# Altium footprint library ref-packages.PCBLIB: 1544 footprints (part 77 of 103)
Each footprint in its own frame and in the unit in brackets; x right, y up, seen from the top. Pads: shape width x height; smd on the part's side, far side on the other; paste and mask are expansions set on the pad; w line width, h text height; cw(c..) or ccw(c..) is an arc to the next point about the centre after c.
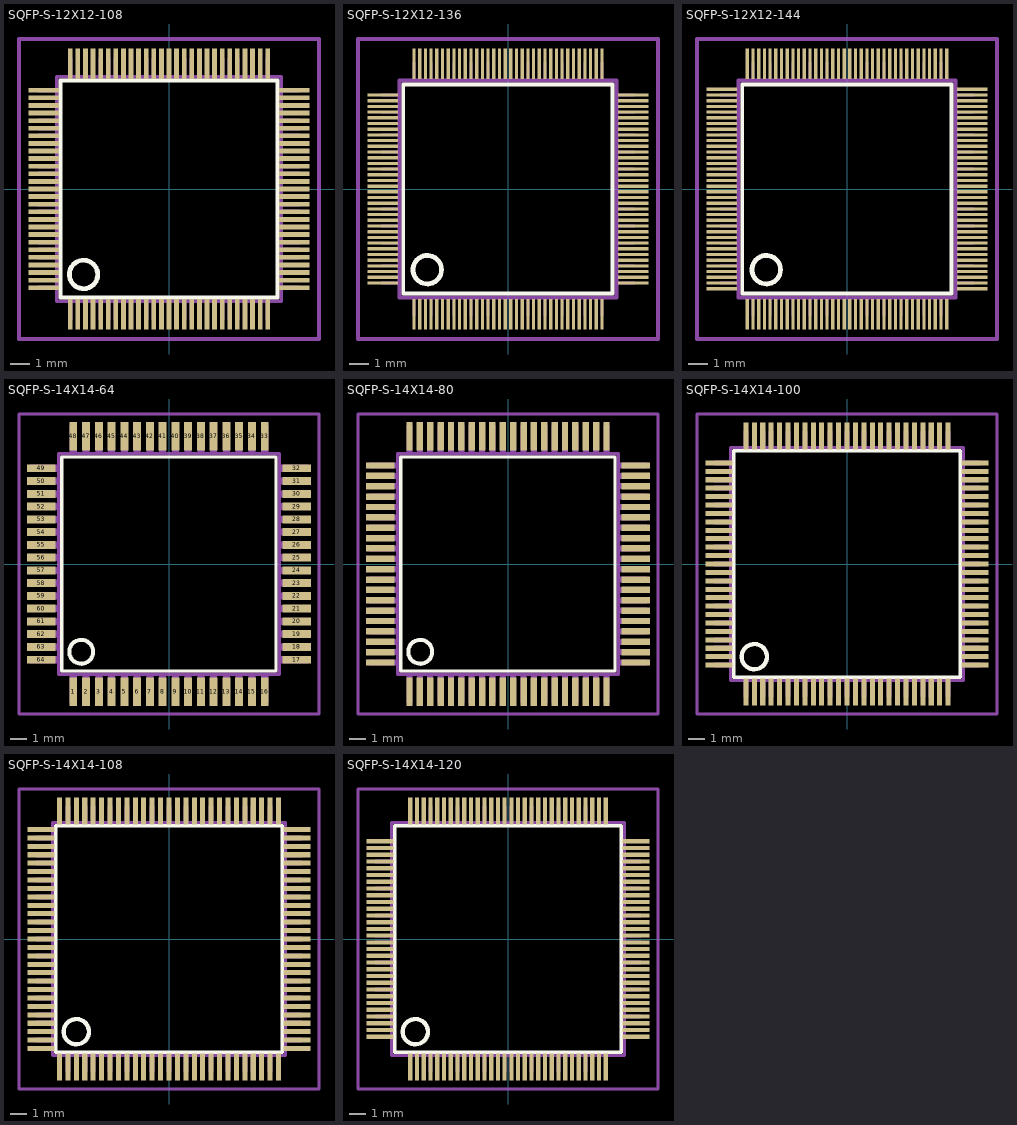
[diagram p76: the footprints below, top view; thin cyan lines are the x and y axes]

## SQFP-S-12X12-108 [mm]
pads (108):
  rect 0.25x1.6 smd: 1(-5.2,-6.6) 2(-4.8,-6.6) 3(-4.4,-6.6) 4(-4,-6.6) 5(-3.6,-6.6) 6(-3.2,-6.6) 7(-2.8,-6.6) 8(-2.4,-6.6) 9(-2,-6.6) 10(-1.6,-6.6) 11(-1.2,-6.6) 12(-0.8,-6.6) 13(-0.4,-6.6) 14(0,-6.6) 15(0.4,-6.6) 16(0.8,-6.6) 17(1.2,-6.6) 18(1.6,-6.6) 19(2,-6.6) 20(2.4,-6.6) 21(2.8,-6.6) 22(3.2,-6.6) 23(3.6,-6.6) 24(4,-6.6) 25(4.4,-6.6) 26(4.8,-6.6) 27(5.2,-6.6) 55(5.2,6.6) 56(4.8,6.6) 57(4.4,6.6) 58(4,6.6) 59(3.6,6.6) 60(3.2,6.6) 61(2.8,6.6) 62(2.4,6.6) 63(2,6.6) 64(1.6,6.6) 65(1.2,6.6) 66(0.8,6.6) 67(0.4,6.6) 68(0,6.6) 69(-0.4,6.6) 70(-0.8,6.6) 71(-1.2,6.6) 72(-1.6,6.6) 73(-2,6.6) 74(-2.4,6.6) 75(-2.8,6.6) 76(-3.2,6.6) 77(-3.6,6.6) 78(-4,6.6) 79(-4.4,6.6) 80(-4.8,6.6) 81(-5.2,6.6)
  rect 1.6x0.25 smd: 28(6.6,-5.2) 29(6.6,-4.8) 30(6.6,-4.4) 31(6.6,-4) 32(6.6,-3.6) 33(6.6,-3.2) 34(6.6,-2.8) 35(6.6,-2.4) 36(6.6,-2) 37(6.6,-1.6) 38(6.6,-1.2) 39(6.6,-0.8) 40(6.6,-0.4) 41(6.6,0) 42(6.6,0.4) 43(6.6,0.8) 44(6.6,1.2) 45(6.6,1.6) 46(6.6,2) 47(6.6,2.4) 48(6.6,2.8) 49(6.6,3.2) 50(6.6,3.6) 51(6.6,4) 52(6.6,4.4) 53(6.6,4.8) 54(6.6,5.2) 82(-6.6,5.2) 83(-6.6,4.8) 84(-6.6,4.4) 85(-6.6,4) 86(-6.6,3.6) 87(-6.6,3.2) 88(-6.6,2.8) 89(-6.6,2.4) 90(-6.6,2) 91(-6.6,1.6) 92(-6.6,1.2) 93(-6.6,0.8) 94(-6.6,0.4) 95(-6.6,0) 96(-6.6,-0.4) 97(-6.6,-0.8) 98(-6.6,-1.2) 99(-6.6,-1.6) 100(-6.6,-2) 101(-6.6,-2.4) 102(-6.6,-2.8) 103(-6.6,-3.2) 104(-6.6,-3.6) 105(-6.6,-4) 106(-6.6,-4.4) 107(-6.6,-4.8) 108(-6.6,-5.2)
Top Overlay:
  circle w0.254: c-4.5,-4.5 r0.75
  lines w0.203: -5.72,-5.71 5.71,-5.71 5.71,5.71 -5.72,5.71 -5.72,-5.71
Mechanical 16:
  rectangle: -5.31,-6.9 -5.09,-5.95
  rectangle: -4.91,-6.9 -4.69,-5.95
  rectangle: -4.51,-6.9 -4.29,-5.95
  rectangle: -4.11,-6.9 -3.89,-5.95
  rectangle: -3.71,-6.9 -3.49,-5.95
  rectangle: -3.31,-6.9 -3.09,-5.95
  rectangle: -2.91,-6.9 -2.69,-5.95
  rectangle: -2.51,-6.9 -2.29,-5.95
  rectangle: -2.11,-6.9 -1.89,-5.95
  rectangle: -1.71,-6.9 -1.49,-5.95
  rectangle: -1.31,-6.9 -1.09,-5.95
  rectangle: -0.91,-6.9 -0.69,-5.95
  rectangle: -0.51,-6.9 -0.29,-5.95
  rectangle: -0.11,-6.9 0.11,-5.95
  rectangle: 0.29,-6.9 0.51,-5.95
  rectangle: 0.69,-6.9 0.91,-5.95
  rectangle: 1.09,-6.9 1.31,-5.95
  rectangle: 1.49,-6.9 1.71,-5.95
  rectangle: 1.89,-6.9 2.11,-5.95
  rectangle: 2.29,-6.9 2.51,-5.95
  rectangle: 2.69,-6.9 2.91,-5.95
  rectangle: 3.09,-6.9 3.31,-5.95
  rectangle: 3.49,-6.9 3.71,-5.95
  rectangle: 3.89,-6.9 4.11,-5.95
  rectangle: 4.29,-6.9 4.51,-5.95
  rectangle: 4.69,-6.9 4.91,-5.95
  rectangle: 5.09,-6.9 5.31,-5.95
  rectangle: 5.95,-5.31 6.9,-5.09
  rectangle: 5.95,-4.91 6.9,-4.69
  rectangle: 5.95,-4.51 6.9,-4.29
  rectangle: 5.95,-4.11 6.9,-3.89
  rectangle: 5.95,-3.71 6.9,-3.49
  rectangle: 5.95,-3.31 6.9,-3.09
  rectangle: 5.95,-2.91 6.9,-2.69
  rectangle: 5.95,-2.51 6.9,-2.29
  rectangle: 5.95,-2.11 6.9,-1.89
  rectangle: 5.95,-1.71 6.9,-1.49
  rectangle: 5.95,-1.31 6.9,-1.09
  rectangle: 5.95,-0.91 6.9,-0.69
  rectangle: 5.95,-0.51 6.9,-0.29
  rectangle: 5.95,-0.11 6.9,0.11
  rectangle: 5.95,0.29 6.9,0.51
  rectangle: 5.95,0.69 6.9,0.91
  rectangle: 5.95,1.09 6.9,1.31
  rectangle: 5.95,1.49 6.9,1.71
  rectangle: 5.95,1.89 6.9,2.11
  rectangle: 5.95,2.29 6.9,2.51
  rectangle: 5.95,2.69 6.9,2.91
  rectangle: 5.95,3.09 6.9,3.31
  rectangle: 5.95,3.49 6.9,3.71
  rectangle: 5.95,3.89 6.9,4.11
  rectangle: 5.95,4.29 6.9,4.51
  rectangle: 5.95,4.69 6.9,4.91
  rectangle: 5.95,5.09 6.9,5.31
  rectangle: 5.09,5.95 5.31,6.9
  rectangle: 4.69,5.95 4.91,6.9
  rectangle: 4.29,5.95 4.51,6.9
  rectangle: 3.89,5.95 4.11,6.9
  rectangle: 3.49,5.95 3.71,6.9
  rectangle: 3.09,5.95 3.31,6.9
  rectangle: 2.69,5.95 2.91,6.9
  rectangle: 2.29,5.95 2.51,6.9
  rectangle: 1.89,5.95 2.11,6.9
  rectangle: 1.49,5.95 1.71,6.9
  rectangle: 1.09,5.95 1.31,6.9
  rectangle: 0.69,5.95 0.91,6.9
  rectangle: 0.29,5.95 0.51,6.9
  rectangle: -0.11,5.95 0.11,6.9
  rectangle: -0.51,5.95 -0.29,6.9
  rectangle: -0.91,5.95 -0.69,6.9
  rectangle: -1.31,5.95 -1.09,6.9
  rectangle: -1.71,5.95 -1.49,6.9
  rectangle: -2.11,5.95 -1.89,6.9
  rectangle: -2.51,5.95 -2.29,6.9
  rectangle: -2.91,5.95 -2.69,6.9
  rectangle: -3.31,5.95 -3.09,6.9
  rectangle: -3.71,5.95 -3.49,6.9
  rectangle: -4.11,5.95 -3.89,6.9
  rectangle: -4.51,5.95 -4.29,6.9
  rectangle: -4.91,5.95 -4.69,6.9
  rectangle: -5.31,5.95 -5.09,6.9
  rectangle: -6.9,5.09 -5.95,5.31
  rectangle: -6.9,4.69 -5.95,4.91
  rectangle: -6.9,4.29 -5.95,4.51
  rectangle: -6.9,3.89 -5.95,4.11
  rectangle: -6.9,3.49 -5.95,3.71
  rectangle: -6.9,3.09 -5.95,3.31
  rectangle: -6.9,2.69 -5.95,2.91
  rectangle: -6.9,2.29 -5.95,2.51
  rectangle: -6.9,1.89 -5.95,2.11
  rectangle: -6.9,1.49 -5.95,1.71
  rectangle: -6.9,1.09 -5.95,1.31
  rectangle: -6.9,0.69 -5.95,0.91
  rectangle: -6.9,0.29 -5.95,0.51
  rectangle: -6.9,-0.11 -5.95,0.11
  rectangle: -6.9,-0.51 -5.95,-0.29
  rectangle: -6.9,-0.91 -5.95,-0.69
  rectangle: -6.9,-1.31 -5.95,-1.09
  rectangle: -6.9,-1.71 -5.95,-1.49
  rectangle: -6.9,-2.11 -5.95,-1.89
  rectangle: -6.9,-2.51 -5.95,-2.29
  rectangle: -6.9,-2.91 -5.95,-2.69
  rectangle: -6.9,-3.31 -5.95,-3.09
  rectangle: -6.9,-3.71 -5.95,-3.49
  rectangle: -6.9,-4.11 -5.95,-3.89
  rectangle: -6.9,-4.51 -5.95,-4.29
  rectangle: -6.9,-4.91 -5.95,-4.69
  rectangle: -6.9,-5.31 -5.95,-5.09
  lines w0.203: -5.91,-5.91 5.91,-5.91 5.91,5.91 -5.91,5.91 -5.91,-5.91
Mechanical 27:
  lines w0.2: -7.9,-7.9 -7.9,7.9 7.9,7.9 7.9,-7.9 -7.9,-7.9

## SQFP-S-12X12-136 [mm]
pads (136):
  rect 0.17x1.6 smd: 1(-4.95,-6.6) 2(-4.65,-6.6) 3(-4.35,-6.6) 4(-4.05,-6.6) 5(-3.75,-6.6) 6(-3.45,-6.6) 7(-3.15,-6.6) 8(-2.85,-6.6) 9(-2.55,-6.6) 10(-2.25,-6.6) 11(-1.95,-6.6) 12(-1.65,-6.6) 13(-1.35,-6.6) 14(-1.05,-6.6) 15(-0.75,-6.6) 16(-0.45,-6.6) 17(-0.15,-6.6) 18(0.15,-6.6) 19(0.45,-6.6) 20(0.75,-6.6) 21(1.05,-6.6) 22(1.35,-6.6) 23(1.65,-6.6) 24(1.95,-6.6) 25(2.25,-6.6) 26(2.55,-6.6) 27(2.85,-6.6) 28(3.15,-6.6) 29(3.45,-6.6) 30(3.75,-6.6) 31(4.05,-6.6) 32(4.35,-6.6) 33(4.65,-6.6) 34(4.95,-6.6) 69(4.95,6.6) 70(4.65,6.6) 71(4.35,6.6) 72(4.05,6.6) 73(3.75,6.6) 74(3.45,6.6) 75(3.15,6.6) 76(2.85,6.6) 77(2.55,6.6) 78(2.25,6.6) 79(1.95,6.6) 80(1.65,6.6) 81(1.35,6.6) 82(1.05,6.6) 83(0.75,6.6) 84(0.45,6.6) 85(0.15,6.6) 86(-0.15,6.6) 87(-0.45,6.6) 88(-0.75,6.6) 89(-1.05,6.6) 90(-1.35,6.6) 91(-1.65,6.6) 92(-1.95,6.6) 93(-2.25,6.6) 94(-2.55,6.6) 95(-2.85,6.6) 96(-3.15,6.6) 97(-3.45,6.6) 98(-3.75,6.6) 99(-4.05,6.6) 100(-4.35,6.6) 101(-4.65,6.6) 102(-4.95,6.6)
  rect 1.6x0.17 smd: 35(6.6,-4.95) 36(6.6,-4.65) 37(6.6,-4.35) 38(6.6,-4.05) 39(6.6,-3.75) 40(6.6,-3.45) 41(6.6,-3.15) 42(6.6,-2.85) 43(6.6,-2.55) 44(6.6,-2.25) 45(6.6,-1.95) 46(6.6,-1.65) 47(6.6,-1.35) 48(6.6,-1.05) 49(6.6,-0.75) 50(6.6,-0.45) 51(6.6,-0.15) 52(6.6,0.15) 53(6.6,0.45) 54(6.6,0.75) 55(6.6,1.05) 56(6.6,1.35) 57(6.6,1.65) 58(6.6,1.95) 59(6.6,2.25) 60(6.6,2.55) 61(6.6,2.85) 62(6.6,3.15) 63(6.6,3.45) 64(6.6,3.75) 65(6.6,4.05) 66(6.6,4.35) 67(6.6,4.65) 68(6.6,4.95) 103(-6.6,4.95) 104(-6.6,4.65) 105(-6.6,4.35) 106(-6.6,4.05) 107(-6.6,3.75) 108(-6.6,3.45) 109(-6.6,3.15) 110(-6.6,2.85) 111(-6.6,2.55) 112(-6.6,2.25) 113(-6.6,1.95) 114(-6.6,1.65) 115(-6.6,1.35) 116(-6.6,1.05) 117(-6.6,0.75) 118(-6.6,0.45) 119(-6.6,0.15) 120(-6.6,-0.15) 121(-6.6,-0.45) 122(-6.6,-0.75) 123(-6.6,-1.05) 124(-6.6,-1.35) 125(-6.6,-1.65) 126(-6.6,-1.95) 127(-6.6,-2.25) 128(-6.6,-2.55) 129(-6.6,-2.85) 130(-6.6,-3.15) 131(-6.6,-3.45) 132(-6.6,-3.75) 133(-6.6,-4.05) 134(-6.6,-4.35) 135(-6.6,-4.65) 136(-6.6,-4.95)
Top Overlay:
  circle w0.254: c-4.25,-4.25 r0.75
  lines w0.203: -5.52,-5.51 5.51,-5.51 5.51,5.51 -5.52,5.51 -5.52,-5.51
Mechanical 16:
  rectangle: -5.02,-6.7 -4.88,-5.75
  rectangle: -4.72,-6.7 -4.58,-5.75
  rectangle: -4.42,-6.7 -4.28,-5.75
  rectangle: -4.12,-6.7 -3.98,-5.75
  rectangle: -3.82,-6.7 -3.68,-5.75
  rectangle: -3.52,-6.7 -3.38,-5.75
  rectangle: -3.22,-6.7 -3.08,-5.75
  rectangle: -2.92,-6.7 -2.78,-5.75
  rectangle: -2.62,-6.7 -2.48,-5.75
  rectangle: -2.32,-6.7 -2.18,-5.75
  rectangle: -2.02,-6.7 -1.88,-5.75
  rectangle: -1.72,-6.7 -1.58,-5.75
  rectangle: -1.42,-6.7 -1.28,-5.75
  rectangle: -1.12,-6.7 -0.98,-5.75
  rectangle: -0.82,-6.7 -0.68,-5.75
  rectangle: -0.52,-6.7 -0.38,-5.75
  rectangle: -0.22,-6.7 -0.08,-5.75
  rectangle: 0.08,-6.7 0.22,-5.75
  rectangle: 0.38,-6.7 0.52,-5.75
  rectangle: 0.68,-6.7 0.82,-5.75
  rectangle: 0.98,-6.7 1.12,-5.75
  rectangle: 1.28,-6.7 1.42,-5.75
  rectangle: 1.58,-6.7 1.72,-5.75
  rectangle: 1.88,-6.7 2.02,-5.75
  rectangle: 2.18,-6.7 2.32,-5.75
  rectangle: 2.48,-6.7 2.62,-5.75
  rectangle: 2.78,-6.7 2.92,-5.75
  rectangle: 3.08,-6.7 3.22,-5.75
  rectangle: 3.38,-6.7 3.52,-5.75
  rectangle: 3.68,-6.7 3.82,-5.75
  rectangle: 3.98,-6.7 4.12,-5.75
  rectangle: 4.28,-6.7 4.42,-5.75
  rectangle: 4.58,-6.7 4.72,-5.75
  rectangle: 4.88,-6.7 5.02,-5.75
  rectangle: 5.75,-5.02 6.7,-4.88
  rectangle: 5.75,-4.72 6.7,-4.58
  rectangle: 5.75,-4.42 6.7,-4.28
  rectangle: 5.75,-4.12 6.7,-3.98
  rectangle: 5.75,-3.82 6.7,-3.68
  rectangle: 5.75,-3.52 6.7,-3.38
  rectangle: 5.75,-3.22 6.7,-3.08
  rectangle: 5.75,-2.92 6.7,-2.78
  rectangle: 5.75,-2.62 6.7,-2.48
  rectangle: 5.75,-2.32 6.7,-2.18
  rectangle: 5.75,-2.02 6.7,-1.88
  rectangle: 5.75,-1.72 6.7,-1.58
  rectangle: 5.75,-1.42 6.7,-1.28
  rectangle: 5.75,-1.12 6.7,-0.98
  rectangle: 5.75,-0.82 6.7,-0.68
  rectangle: 5.75,-0.52 6.7,-0.38
  rectangle: 5.75,-0.22 6.7,-0.08
  rectangle: 5.75,0.08 6.7,0.22
  rectangle: 5.75,0.38 6.7,0.52
  rectangle: 5.75,0.68 6.7,0.82
  rectangle: 5.75,0.98 6.7,1.12
  rectangle: 5.75,1.28 6.7,1.42
  rectangle: 5.75,1.58 6.7,1.72
  rectangle: 5.75,1.88 6.7,2.02
  rectangle: 5.75,2.18 6.7,2.32
  rectangle: 5.75,2.48 6.7,2.62
  rectangle: 5.75,2.78 6.7,2.92
  rectangle: 5.75,3.08 6.7,3.22
  rectangle: 5.75,3.38 6.7,3.52
  rectangle: 5.75,3.68 6.7,3.82
  rectangle: 5.75,3.98 6.7,4.12
  rectangle: 5.75,4.28 6.7,4.42
  rectangle: 5.75,4.58 6.7,4.72
  rectangle: 5.75,4.88 6.7,5.02
  rectangle: 4.88,5.75 5.02,6.7
  rectangle: 4.58,5.75 4.72,6.7
  rectangle: 4.28,5.75 4.42,6.7
  rectangle: 3.98,5.75 4.12,6.7
  rectangle: 3.68,5.75 3.82,6.7
  rectangle: 3.38,5.75 3.52,6.7
  rectangle: 3.08,5.75 3.22,6.7
  rectangle: 2.78,5.75 2.92,6.7
  rectangle: 2.48,5.75 2.62,6.7
  rectangle: 2.18,5.75 2.32,6.7
  rectangle: 1.88,5.75 2.02,6.7
  rectangle: 1.58,5.75 1.72,6.7
  rectangle: 1.28,5.75 1.42,6.7
  rectangle: 0.98,5.75 1.12,6.7
  rectangle: 0.68,5.75 0.82,6.7
  rectangle: 0.38,5.75 0.52,6.7
  rectangle: 0.08,5.75 0.22,6.7
  rectangle: -0.22,5.75 -0.08,6.7
  rectangle: -0.52,5.75 -0.38,6.7
  rectangle: -0.82,5.75 -0.68,6.7
  rectangle: -1.12,5.75 -0.98,6.7
  rectangle: -1.42,5.75 -1.28,6.7
  rectangle: -1.72,5.75 -1.58,6.7
  rectangle: -2.02,5.75 -1.88,6.7
  rectangle: -2.32,5.75 -2.18,6.7
  rectangle: -2.62,5.75 -2.48,6.7
  rectangle: -2.92,5.75 -2.78,6.7
  rectangle: -3.22,5.75 -3.08,6.7
  rectangle: -3.52,5.75 -3.38,6.7
  rectangle: -3.82,5.75 -3.68,6.7
  rectangle: -4.12,5.75 -3.98,6.7
  rectangle: -4.42,5.75 -4.28,6.7
  rectangle: -4.72,5.75 -4.58,6.7
  rectangle: -5.02,5.75 -4.88,6.7
  rectangle: -6.7,4.88 -5.75,5.02
  rectangle: -6.7,4.58 -5.75,4.72
  rectangle: -6.7,4.28 -5.75,4.42
  rectangle: -6.7,3.98 -5.75,4.12
  rectangle: -6.7,3.68 -5.75,3.82
  rectangle: -6.7,3.38 -5.75,3.52
  rectangle: -6.7,3.08 -5.75,3.22
  rectangle: -6.7,2.78 -5.75,2.92
  rectangle: -6.7,2.48 -5.75,2.62
  rectangle: -6.7,2.18 -5.75,2.32
  rectangle: -6.7,1.88 -5.75,2.02
  rectangle: -6.7,1.58 -5.75,1.72
  rectangle: -6.7,1.28 -5.75,1.42
  rectangle: -6.7,0.98 -5.75,1.12
  rectangle: -6.7,0.68 -5.75,0.82
  rectangle: -6.7,0.38 -5.75,0.52
  rectangle: -6.7,0.08 -5.75,0.22
  rectangle: -6.7,-0.22 -5.75,-0.08
  rectangle: -6.7,-0.52 -5.75,-0.38
  rectangle: -6.7,-0.82 -5.75,-0.68
  rectangle: -6.7,-1.12 -5.75,-0.98
  rectangle: -6.7,-1.42 -5.75,-1.28
  rectangle: -6.7,-1.72 -5.75,-1.58
  rectangle: -6.7,-2.02 -5.75,-1.88
  rectangle: -6.7,-2.32 -5.75,-2.18
  rectangle: -6.7,-2.62 -5.75,-2.48
  rectangle: -6.7,-2.92 -5.75,-2.78
  rectangle: -6.7,-3.22 -5.75,-3.08
  rectangle: -6.7,-3.52 -5.75,-3.38
  rectangle: -6.7,-3.82 -5.75,-3.68
  rectangle: -6.7,-4.12 -5.75,-3.98
  rectangle: -6.7,-4.42 -5.75,-4.28
  rectangle: -6.7,-4.72 -5.75,-4.58
  rectangle: -6.7,-5.02 -5.75,-4.88
  lines w0.203: -5.71,-5.71 5.71,-5.71 5.71,5.71 -5.71,5.71 -5.71,-5.71
Mechanical 27:
  lines w0.2: -7.9,-7.9 -7.9,7.9 7.9,7.9 7.9,-7.9 -7.9,-7.9

## SQFP-S-12X12-144 [mm]
pads (144):
  rect 0.17x1.6 smd: 1(-5.25,-6.6) 2(-4.95,-6.6) 3(-4.65,-6.6) 4(-4.35,-6.6) 5(-4.05,-6.6) 6(-3.75,-6.6) 7(-3.45,-6.6) 8(-3.15,-6.6) 9(-2.85,-6.6) 10(-2.55,-6.6) 11(-2.25,-6.6) 12(-1.95,-6.6) 13(-1.65,-6.6) 14(-1.35,-6.6) 15(-1.05,-6.6) 16(-0.75,-6.6) 17(-0.45,-6.6) 18(-0.15,-6.6) 19(0.15,-6.6) 20(0.45,-6.6) 21(0.75,-6.6) 22(1.05,-6.6) 23(1.35,-6.6) 24(1.65,-6.6) 25(1.95,-6.6) 26(2.25,-6.6) 27(2.55,-6.6) 28(2.85,-6.6) 29(3.15,-6.6) 30(3.45,-6.6) 31(3.75,-6.6) 32(4.05,-6.6) 33(4.35,-6.6) 34(4.65,-6.6) 35(4.95,-6.6) 36(5.25,-6.6) 73(5.25,6.6) 74(4.95,6.6) 75(4.65,6.6) 76(4.35,6.6) 77(4.05,6.6) 78(3.75,6.6) 79(3.45,6.6) 80(3.15,6.6) 81(2.85,6.6) 82(2.55,6.6) 83(2.25,6.6) 84(1.95,6.6) 85(1.65,6.6) 86(1.35,6.6) 87(1.05,6.6) 88(0.75,6.6) 89(0.45,6.6) 90(0.15,6.6) 91(-0.15,6.6) 92(-0.45,6.6) 93(-0.75,6.6) 94(-1.05,6.6) 95(-1.35,6.6) 96(-1.65,6.6) 97(-1.95,6.6) 98(-2.25,6.6) 99(-2.55,6.6) 100(-2.85,6.6) 101(-3.15,6.6) 102(-3.45,6.6) 103(-3.75,6.6) 104(-4.05,6.6) 105(-4.35,6.6) 106(-4.65,6.6) 107(-4.95,6.6) 108(-5.25,6.6)
  rect 1.6x0.17 smd: 37(6.6,-5.25) 38(6.6,-4.95) 39(6.6,-4.65) 40(6.6,-4.35) 41(6.6,-4.05) 42(6.6,-3.75) 43(6.6,-3.45) 44(6.6,-3.15) 45(6.6,-2.85) 46(6.6,-2.55) 47(6.6,-2.25) 48(6.6,-1.95) 49(6.6,-1.65) 50(6.6,-1.35) 51(6.6,-1.05) 52(6.6,-0.75) 53(6.6,-0.45) 54(6.6,-0.15) 55(6.6,0.15) 56(6.6,0.45) 57(6.6,0.75) 58(6.6,1.05) 59(6.6,1.35) 60(6.6,1.65) 61(6.6,1.95) 62(6.6,2.25) 63(6.6,2.55) 64(6.6,2.85) 65(6.6,3.15) 66(6.6,3.45) 67(6.6,3.75) 68(6.6,4.05) 69(6.6,4.35) 70(6.6,4.65) 71(6.6,4.95) 72(6.6,5.25) 109(-6.6,5.25) 110(-6.6,4.95) 111(-6.6,4.65) 112(-6.6,4.35) 113(-6.6,4.05) 114(-6.6,3.75) 115(-6.6,3.45) 116(-6.6,3.15) 117(-6.6,2.85) 118(-6.6,2.55) 119(-6.6,2.25) 120(-6.6,1.95) 121(-6.6,1.65) 122(-6.6,1.35) 123(-6.6,1.05) 124(-6.6,0.75) 125(-6.6,0.45) 126(-6.6,0.15) 127(-6.6,-0.15) 128(-6.6,-0.45) 129(-6.6,-0.75) 130(-6.6,-1.05) 131(-6.6,-1.35) 132(-6.6,-1.65) 133(-6.6,-1.95) 134(-6.6,-2.25) 135(-6.6,-2.55) 136(-6.6,-2.85) 137(-6.6,-3.15) 138(-6.6,-3.45) 139(-6.6,-3.75) 140(-6.6,-4.05) 141(-6.6,-4.35) 142(-6.6,-4.65) 143(-6.6,-4.95) 144(-6.6,-5.25)
Top Overlay:
  circle w0.254: c-4.25,-4.25 r0.75
  lines w0.203: -5.52,-5.51 5.51,-5.51 5.51,5.51 -5.52,5.51 -5.52,-5.51
Mechanical 16:
  rectangle: -5.32,-6.7 -5.18,-5.75
  rectangle: -5.02,-6.7 -4.88,-5.75
  rectangle: -4.72,-6.7 -4.58,-5.75
  rectangle: -4.42,-6.7 -4.28,-5.75
  rectangle: -4.12,-6.7 -3.98,-5.75
  rectangle: -3.82,-6.7 -3.68,-5.75
  rectangle: -3.52,-6.7 -3.38,-5.75
  rectangle: -3.22,-6.7 -3.08,-5.75
  rectangle: -2.92,-6.7 -2.78,-5.75
  rectangle: -2.62,-6.7 -2.48,-5.75
  rectangle: -2.32,-6.7 -2.18,-5.75
  rectangle: -2.02,-6.7 -1.88,-5.75
  rectangle: -1.72,-6.7 -1.58,-5.75
  rectangle: -1.42,-6.7 -1.28,-5.75
  rectangle: -1.12,-6.7 -0.98,-5.75
  rectangle: -0.82,-6.7 -0.68,-5.75
  rectangle: -0.52,-6.7 -0.38,-5.75
  rectangle: -0.22,-6.7 -0.08,-5.75
  rectangle: 0.08,-6.7 0.22,-5.75
  rectangle: 0.38,-6.7 0.52,-5.75
  rectangle: 0.68,-6.7 0.82,-5.75
  rectangle: 0.98,-6.7 1.12,-5.75
  rectangle: 1.28,-6.7 1.42,-5.75
  rectangle: 1.58,-6.7 1.72,-5.75
  rectangle: 1.88,-6.7 2.02,-5.75
  rectangle: 2.18,-6.7 2.32,-5.75
  rectangle: 2.48,-6.7 2.62,-5.75
  rectangle: 2.78,-6.7 2.92,-5.75
  rectangle: 3.08,-6.7 3.22,-5.75
  rectangle: 3.38,-6.7 3.52,-5.75
  rectangle: 3.68,-6.7 3.82,-5.75
  rectangle: 3.98,-6.7 4.12,-5.75
  rectangle: 4.28,-6.7 4.42,-5.75
  rectangle: 4.58,-6.7 4.72,-5.75
  rectangle: 4.88,-6.7 5.02,-5.75
  rectangle: 5.18,-6.7 5.32,-5.75
  rectangle: 5.75,-5.32 6.7,-5.18
  rectangle: 5.75,-5.02 6.7,-4.88
  rectangle: 5.75,-4.72 6.7,-4.58
  rectangle: 5.75,-4.42 6.7,-4.28
  rectangle: 5.75,-4.12 6.7,-3.98
  rectangle: 5.75,-3.82 6.7,-3.68
  rectangle: 5.75,-3.52 6.7,-3.38
  rectangle: 5.75,-3.22 6.7,-3.08
  rectangle: 5.75,-2.92 6.7,-2.78
  rectangle: 5.75,-2.62 6.7,-2.48
  rectangle: 5.75,-2.32 6.7,-2.18
  rectangle: 5.75,-2.02 6.7,-1.88
  rectangle: 5.75,-1.72 6.7,-1.58
  rectangle: 5.75,-1.42 6.7,-1.28
  rectangle: 5.75,-1.12 6.7,-0.98
  rectangle: 5.75,-0.82 6.7,-0.68
  rectangle: 5.75,-0.52 6.7,-0.38
  rectangle: 5.75,-0.22 6.7,-0.08
  rectangle: 5.75,0.08 6.7,0.22
  rectangle: 5.75,0.38 6.7,0.52
  rectangle: 5.75,0.68 6.7,0.82
  rectangle: 5.75,0.98 6.7,1.12
  rectangle: 5.75,1.28 6.7,1.42
  rectangle: 5.75,1.58 6.7,1.72
  rectangle: 5.75,1.88 6.7,2.02
  rectangle: 5.75,2.18 6.7,2.32
  rectangle: 5.75,2.48 6.7,2.62
  rectangle: 5.75,2.78 6.7,2.92
  rectangle: 5.75,3.08 6.7,3.22
  rectangle: 5.75,3.38 6.7,3.52
  rectangle: 5.75,3.68 6.7,3.82
  rectangle: 5.75,3.98 6.7,4.12
  rectangle: 5.75,4.28 6.7,4.42
  rectangle: 5.75,4.58 6.7,4.72
  rectangle: 5.75,4.88 6.7,5.02
  rectangle: 5.75,5.18 6.7,5.32
  rectangle: 5.18,5.75 5.32,6.7
  rectangle: 4.88,5.75 5.02,6.7
  rectangle: 4.58,5.75 4.72,6.7
  rectangle: 4.28,5.75 4.42,6.7
  rectangle: 3.98,5.75 4.12,6.7
  rectangle: 3.68,5.75 3.82,6.7
  rectangle: 3.38,5.75 3.52,6.7
  rectangle: 3.08,5.75 3.22,6.7
  rectangle: 2.78,5.75 2.92,6.7
  rectangle: 2.48,5.75 2.62,6.7
  rectangle: 2.18,5.75 2.32,6.7
  rectangle: 1.88,5.75 2.02,6.7
  rectangle: 1.58,5.75 1.72,6.7
  rectangle: 1.28,5.75 1.42,6.7
  rectangle: 0.98,5.75 1.12,6.7
  rectangle: 0.68,5.75 0.82,6.7
  rectangle: 0.38,5.75 0.52,6.7
  rectangle: 0.08,5.75 0.22,6.7
  rectangle: -0.22,5.75 -0.08,6.7
  rectangle: -0.52,5.75 -0.38,6.7
  rectangle: -0.82,5.75 -0.68,6.7
  rectangle: -1.12,5.75 -0.98,6.7
  rectangle: -1.42,5.75 -1.28,6.7
  rectangle: -1.72,5.75 -1.58,6.7
  rectangle: -2.02,5.75 -1.88,6.7
  rectangle: -2.32,5.75 -2.18,6.7
  rectangle: -2.62,5.75 -2.48,6.7
  rectangle: -2.92,5.75 -2.78,6.7
  rectangle: -3.22,5.75 -3.08,6.7
  rectangle: -3.52,5.75 -3.38,6.7
  rectangle: -3.82,5.75 -3.68,6.7
  rectangle: -4.12,5.75 -3.98,6.7
  rectangle: -4.42,5.75 -4.28,6.7
  rectangle: -4.72,5.75 -4.58,6.7
  rectangle: -5.02,5.75 -4.88,6.7
  rectangle: -5.32,5.75 -5.18,6.7
  rectangle: -6.7,5.18 -5.75,5.32
  rectangle: -6.7,4.88 -5.75,5.02
  rectangle: -6.7,4.58 -5.75,4.72
  rectangle: -6.7,4.28 -5.75,4.42
  rectangle: -6.7,3.98 -5.75,4.12
  rectangle: -6.7,3.68 -5.75,3.82
  rectangle: -6.7,3.38 -5.75,3.52
  rectangle: -6.7,3.08 -5.75,3.22
  rectangle: -6.7,2.78 -5.75,2.92
  rectangle: -6.7,2.48 -5.75,2.62
  rectangle: -6.7,2.18 -5.75,2.32
  rectangle: -6.7,1.88 -5.75,2.02
  rectangle: -6.7,1.58 -5.75,1.72
  rectangle: -6.7,1.28 -5.75,1.42
  rectangle: -6.7,0.98 -5.75,1.12
  rectangle: -6.7,0.68 -5.75,0.82
  rectangle: -6.7,0.38 -5.75,0.52
  rectangle: -6.7,0.08 -5.75,0.22
  rectangle: -6.7,-0.22 -5.75,-0.08
  rectangle: -6.7,-0.52 -5.75,-0.38
  rectangle: -6.7,-0.82 -5.75,-0.68
  rectangle: -6.7,-1.12 -5.75,-0.98
  rectangle: -6.7,-1.42 -5.75,-1.28
  rectangle: -6.7,-1.72 -5.75,-1.58
  rectangle: -6.7,-2.02 -5.75,-1.88
  rectangle: -6.7,-2.32 -5.75,-2.18
  rectangle: -6.7,-2.62 -5.75,-2.48
  rectangle: -6.7,-2.92 -5.75,-2.78
  rectangle: -6.7,-3.22 -5.75,-3.08
  rectangle: -6.7,-3.52 -5.75,-3.38
  rectangle: -6.7,-3.82 -5.75,-3.68
  rectangle: -6.7,-4.12 -5.75,-3.98
  rectangle: -6.7,-4.42 -5.75,-4.28
  rectangle: -6.7,-4.72 -5.75,-4.58
  rectangle: -6.7,-5.02 -5.75,-4.88
  rectangle: -6.7,-5.32 -5.75,-5.18
  lines w0.203: -5.71,-5.71 5.71,-5.71 5.71,5.71 -5.71,5.71 -5.71,-5.71
Mechanical 27:
  lines w0.2: -7.9,-7.9 -7.9,7.9 7.9,7.9 7.9,-7.9 -7.9,-7.9
